# Altium footprint library PCBLIB.PcbLib: 557 footprints (part 18 of 36)
Each footprint in its own frame and in the unit in brackets; x right, y up, seen from the top. Pads: shape width x height; smd on the part's side, far side on the other; paste and mask are expansions set on the pad; w line width, h text height; cw(c..) or ccw(c..) is an arc to the next point about the centre after c.
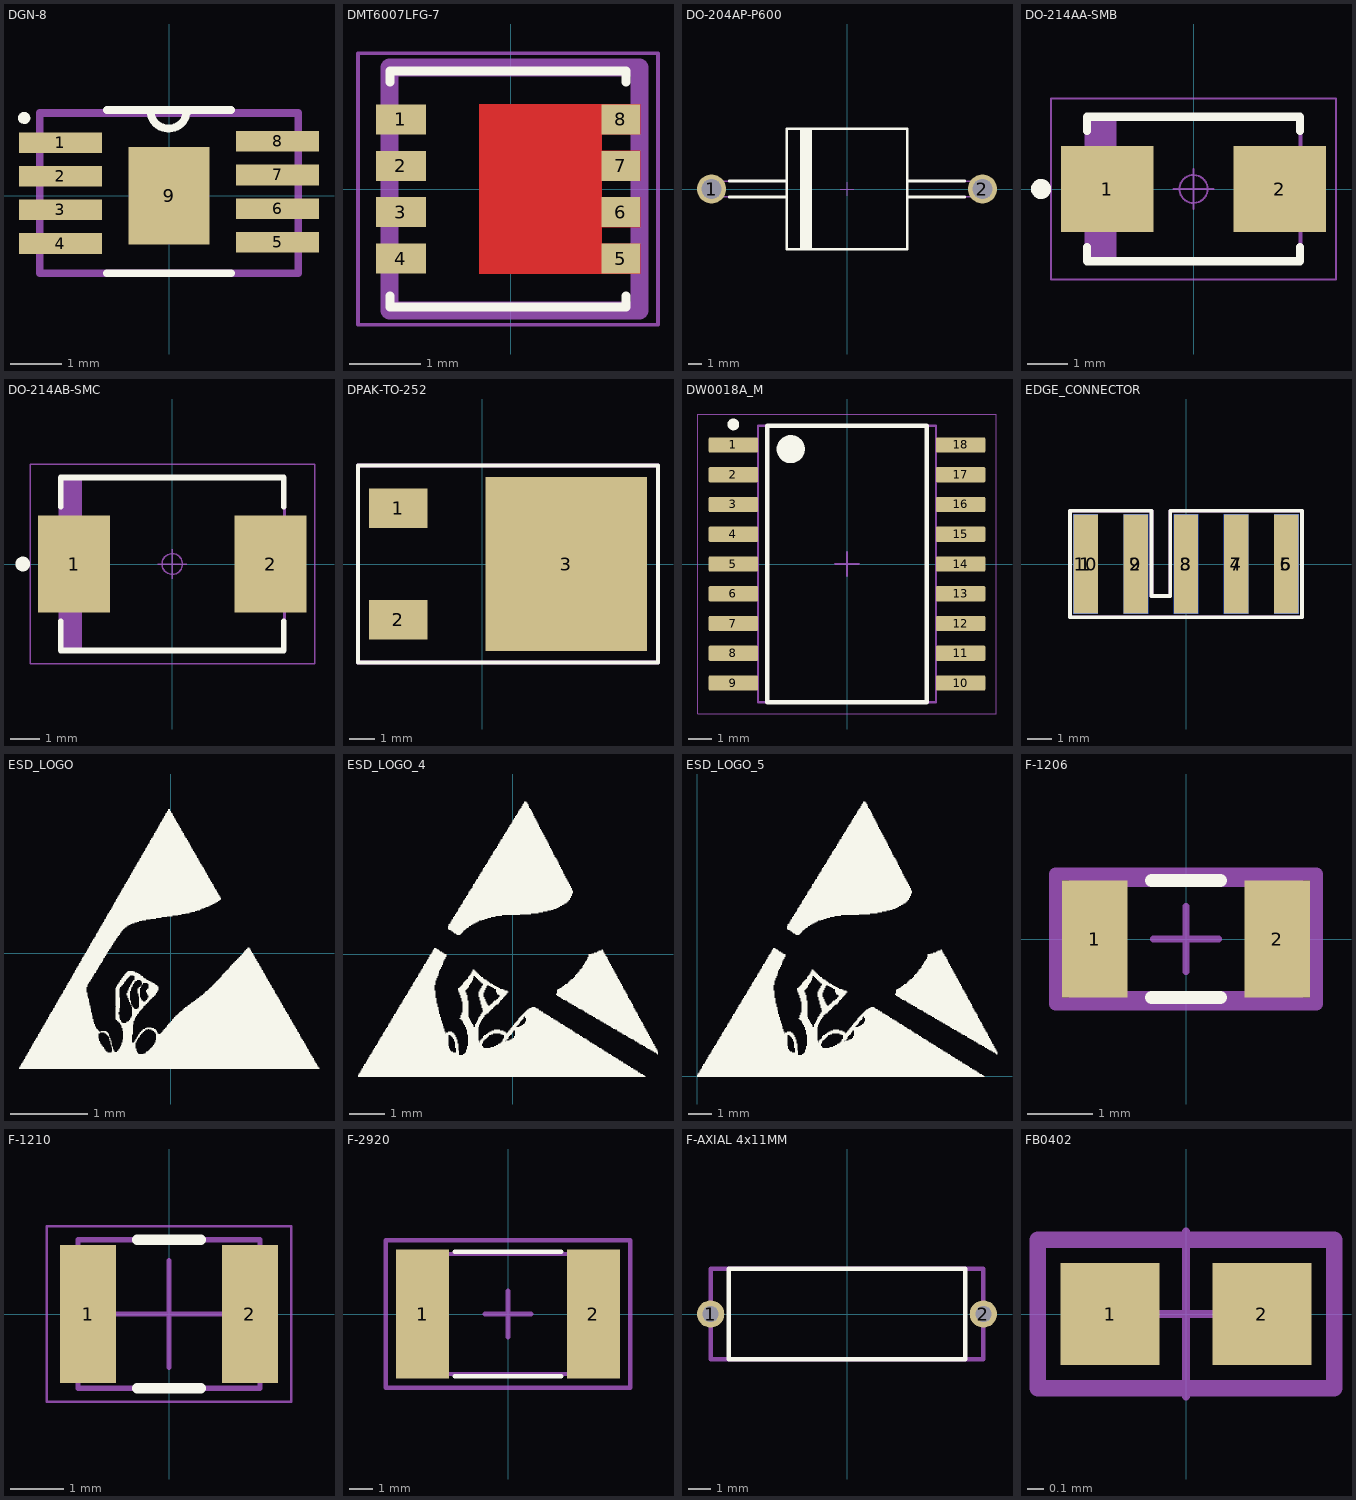
[diagram p17: the footprints below, top view; thin cyan lines are the x and y axes]

## DGN-8 [mm]
pads (9):
  rect 1.6x0.4 smd mask+0.07: 1(-2.1,1.025) 2(-2.1,0.375) 3(-2.1,-0.275) 4(-2.1,-0.925) 5(2.1,-0.9) 6(2.1,-0.25) 7(2.1,0.4) 8(2.1,1.05)
  rect 1.57x1.89 smd mask+0.07: 9(0,0)
Top Overlay:
  lines w0.15: -2.831,1.471 cw(c-2.8,1.5) -2.8,1.457 ; -1.2,-1.5 1.2,-1.5 ; -1.2,1.657 1.2,1.657 ; -0.359,1.641 ccw(c-0.017,1.641) -0.259,1.4 ccw(c-0.017,1.641) -0.017,1.3 ; 0,1.3 ccw(c0,1.641) 0.241,1.4 ccw(c0,1.641) 0.341,1.641
ASM Top:
  lines w0.15: -2.5,-1.5 2.5,-1.5 2.5,1.6 -2.5,1.6 -2.5,-1.5
  text ".designator" at -0.4,-0.1 h0.8
3D body "DGN8_1P89x1P57.step": height 1.09, standoff -0.05, extent -2.527,-1.5 2.527,1.598

## DMT6007LFG-7 [mm] "DMT6007LFG-7"
height 0.85
pads (8):
  rect 0.7x0.42 smd: 1(-1.54,0.975) 2(-1.54,0.325) 3(-1.54,-0.325) 4(-1.54,-0.975)
  rect 0.54x0.42 smd: 5(1.54,-0.975) 6(1.54,-0.325) 7(1.54,0.325) 8(1.54,0.975)
Top Layer:
  region: 1.81,0.765 1.27,0.765 1.27,0.535 1.81,0.535 1.81,0.115 1.27,0.115 1.27,-0.115 1.81,-0.115 1.81,-0.535 1.27,-0.535 1.27,-0.765 1.81,-0.765 1.81,-1.185 -0.44,-1.185 -0.44,1.185 1.81,1.185
Top Overlay:
  lines w0.127: -1.69,-1.499 -1.69,-1.65 1.61,-1.65 1.61,-1.499 ; -1.69,1.499 -1.69,1.65 1.61,1.65 1.61,1.499
Top Paste:
  region: 0.96,-0.9 -0.14,-0.9 -0.14,0.9 0.96,0.9
Top Solder:
  region: 1.37,-1.285 -0.54,-1.285 -0.54,1.285 1.37,1.285
Mechanical 15:
  lines w0.05: -2.14,-1.9 -2.14,1.9 2.06,1.9 2.06,-1.9 -2.14,-1.9
ASM Top:
  lines w0.254: -1.7,-1.7 1.8,-1.7 1.8,1.7 -1.7,1.7 -1.7,-1.7
  text ".designator" at -1.5,-0.5 h0.8
3D body "PowerDI3333-8.stp": height 0.85, standoff 0.04, extent -1.65,-1.65 1.65,1.65

## DO-204AP-P600 [mm] "Diode, Axial; Lead Spacing 20.40mm, Lead Dia. 1.25mm, Body Length 8.85mm, Body Dia. 8.85mm"
height 9.1
pads (2):
  round 2.2 hole 1.5: 1(-10.2,0) 2(10.2,0)
Top Overlay:
  lines w0.2: -8.88,-0.6 -4.55,-0.6 ; -8.88,0.6 -4.55,0.6 ; -3.45,-4.55 -3.45,4.55 ; -3.35,-4.55 -3.35,4.55 ; -3.25,-4.55 -3.25,4.55 ; -3.15,-4.55 -3.15,4.55 ; -3.05,-4.55 -3.05,4.55 ; -2.95,-4.55 -2.95,4.55 ; -2.85,-4.55 -2.85,4.55 ; -2.75,-4.55 -2.75,4.55 ; 4.55,-0.6 8.88,-0.6 ; 4.55,0.6 8.88,0.6 ; -4.55,-4.55 -4.55,4.55 4.55,4.55 4.55,-4.55 -4.55,-4.55
Mechanical 8:
  lines w0.05: -10.7,0 -10.2,0 ; -10.2,-0.5 -10.2,0 ; -10.2,0.5 -10.2,0 ; -9.7,0 -10.2,0 ; -0.5,0 0,0 ; 0,-0.5 0,0 ; 0,0.5 0,0 ; 0.5,0 0,0 ; 9.7,0 10.2,0 ; 10.2,-0.5 10.2,0 ; 10.2,0.5 10.2,0 ; 10.7,0 10.2,0
Mechanical 14:
  lines w0.1: -4.55,-0.6 -10.2,-0.6 cw(c-10.2,0) -10.2,0.6 -4.55,0.6 ; -3.45,-4.55 -3.45,4.55 ; -3.35,-4.55 -3.35,4.55 ; -3.25,-4.55 -3.25,4.55 ; -3.15,-4.55 -3.15,4.55 ; -3.05,-4.55 -3.05,4.55 ; -2.95,-4.55 -2.95,4.55 ; -2.85,-4.55 -2.85,4.55 ; -2.75,-4.55 -2.75,4.55 ; 4.55,-0.6 10.2,-0.6 ccw(c10.2,0) 10.2,0.6 4.55,0.6 ; -4.55,-4.55 -4.55,4.55 4.55,4.55 4.55,-4.55 -4.55,-4.55
3D body "DIOAD2040W125L885D885.stp": height 9.1, standoff -3.6, extent -10.799,-4.55 10.799,4.55

## DO-214AA-SMB [mm] "DO-214-AA/SMB Diode, Molded Body; 5.34mm L X 3.625mm W X 2.65mm H, IPC Medium Density"
height 2.65
pads (2):
  rect 2.3x2.15 smd: 1(-2.15,0) 2(2.15,0)
Top Overlay:
  circle w0.25: c-3.8,0 r0.125
  lines w0.2: -2.65,-1.45 -2.65,-1.8 2.65,-1.8 2.65,-1.45 ; -2.65,1.45 -2.65,1.8 2.65,1.8 2.65,1.45
Mechanical 14:
  lines w0.1: -2.57,-1.812 -2.57,1.812 ; -2.47,-1.812 -2.47,1.812 ; -2.37,-1.812 -2.37,1.812 ; -2.27,-1.812 -2.27,1.812 ; -2.17,-1.812 -2.17,1.812 ; -2.07,-1.812 -2.07,1.812 ; -1.97,-1.812 -1.97,1.812 ; -2.67,-1.812 2.67,-1.812 2.67,1.812 -2.67,1.812 ; -2.67,-1.812 -2.67,1.812 ; -2.67,-1.812 -2.67,1.812
Mechanical 15:
  circle w0.05: c0,0 r0.35
  lines w0.05: -0.5,0 0.5,0 ; 0,-0.5 0,0.5 ; -3.55,-2.25 3.55,-2.25 3.55,2.25 -3.55,2.25 -3.55,-2.25
3D body "DIOM5336X240N.stp": height 2.4, standoff 0, extent -2.7,-1.95 2.7,1.95

## DO-214AB-SMC [mm] "DO-214-AB/SMC Molded Diode, Body 7.95x5.9mm, IPC Medium Density"
height 2.65
pads (2):
  rect 2.45x3.3 smd: 1(-3.35,0) 2(3.35,0)
Top Overlay:
  circle w0.25: c-5.1,0 r0.125
  lines w0.2: -3.8,-1.95 -3.8,-2.95 3.8,-2.95 3.8,-1.95 ; -3.8,1.95 -3.8,2.95 3.8,2.95 3.8,1.95
Mechanical 14:
  lines w0.1: -3.725,-2.95 -3.725,2.95 ; -3.625,-2.95 -3.625,2.95 ; -3.525,-2.95 -3.525,2.95 ; -3.425,-2.95 -3.425,2.95 ; -3.325,-2.95 -3.325,2.95 ; -3.225,-2.95 -3.225,2.95 ; -3.125,-2.95 -3.125,2.95 ; -3.825,-2.95 3.825,-2.95 3.825,2.95 -3.825,2.95 -3.825,-2.95
Mechanical 15:
  circle w0.05: c0,0 r0.35
  lines w0.05: -0.5,0 0.5,0 ; 0,-0.5 0,0.5 ; -4.85,-3.4 4.85,-3.4 4.85,3.4 -4.85,3.4 -4.85,-3.4
3D body "DIOM7659X265N.stp": height 2.65, standoff 0, extent -3.975,-2.95 3.975,2.95

## DPAK-TO-252 [mil]
pads (3):
  rect 89x60 smd: 1(-127.5,85) 2(-127.5,-85)
  rect 245x265 smd: 3(127.5,0)
Top Overlay:
  lines w6: -189,-150 267,-150 267,150 -189,150 -189,-150
ASM Top:
  lines w6: -189,-150 267,-150 267,150 -189,150 -189,-150
  text ".designator" at 3.94,0 h31.5
3D body "DPAK_TO-252AA.STEP": height 94.99, standoff 0.5, extent -157.5,-132 240.14,133.11

## DW0018A_M [mm] "SOIC, 18-Leads, Body 11.8x7.6mm, Pitch 1.27mm, IPC Low Density"
height 2.65
pads (18):
  rrect15% 2.1x0.65 smd: 1(-4.85,5.08) 2(-4.85,3.81) 3(-4.85,2.54) 4(-4.85,1.27) 5(-4.85,0) 6(-4.85,-1.27) 7(-4.85,-2.54) 8(-4.85,-3.81) 9(-4.85,-5.08) 10(4.85,-5.08) 11(4.85,-3.81) 12(4.85,-2.54) 13(4.85,-1.27) 14(4.85,0) 15(4.85,1.27) 16(4.85,2.54) 17(4.85,3.81) 18(4.85,5.08)
Top Overlay:
  circle w0.25: c-4.85,5.955 r0.125
  circle w0.6: c-2.4,4.9 r0.3
  lines w0.2: -3.4,-5.9 -3.4,5.9 3.4,5.9 3.4,-5.9 -3.4,-5.9
Mechanical 15:
  lines w0.05: -6.375,-6.4 -6.375,6.4 6.375,6.4 6.375,-6.4 -6.375,-6.4
  lines w0.1: -0.5,0 0.5,0 ; 0,-0.5 0,0.5
ASM Top:
  circle w0.1: c-2.9,5 r0
  lines w0.1: -3.8,-5.9 3.8,-5.9 3.8,5.9 -3.8,5.9 -3.8,-5.9
  text ".designator" at -1.46,-0.1 h0.8
3D body "User Library-IPC SO.step": height 2.66, standoff -0.14, extent -5.188,-5.875 5.188,5.875

## EDGE_CONNECTOR [mil]
pads (10):
  rect 39x158 smd mask+1: 1(-160,0) 2(-80,0) 3(0,0) 4(80,0) 5(160,0)
  rect 39x158 smd far side mask+1: 6(160,0) 7(80,0) 8(0,0) 9(-80,0) 10(-160,0)
Top Overlay:
  lines w6: -185,-85 -185,85 -55,85 -55,-51 -25,-51 -25,85 185,85 185,-85 -185,-85
Bottom Overlay:
  lines w6: -185,-85 -185,85 -55,85 -55,-51 -25,-51 -25,85 185,85 185,-85 -185,-85
ASM Top:
  lines w6: -185,-85 -185,85 -55,85 -55,-51 -25,-51 -25,85 185,85 185,-85 -185,-85
  text ".designator" at 10,-35 h31.5

## ESD_LOGO [mm]
Top Overlay:
  drawing of 1 lines, arcs and shapes, not listed

## ESD_LOGO_4 [mm]
Top Overlay:
  drawing of 682 lines, arcs and shapes, not listed

## ESD_LOGO_5 [mm]
Top Overlay:
  drawing of 682 lines, arcs and shapes, not listed

## F-1206 [mm]
pads (2):
  rect 1x1.8 smd paste+0 mask+0: 1(-1.4,0) 2(1.4,0)
Top Overlay:
  lines w0.2: -0.525,-0.9 0.525,-0.9 ; -0.525,0.9 0.525,0.9
Mechanical 15:
  lines w0.2: -2,-1 -2,1 2,1 2,-1 -2,-1
Mechanical 16:
  lines w0.1: -0.5,0 0.5,0 ; 0,-0.5 0,0.5
ASM Top:
  lines w0.2: -1.7,-0.9 1.7,-0.9 1.7,0.9 -1.7,0.9 -1.7,-0.9
  text ".Designator" at 0,0.188 h1
3D body "Fuse_Littelfuse_1206L005-60WR_eec.STEP": height 1.25, standoff 0, extent -1.6,-0.825 1.6,0.825

## F-1210 [mm] "PTC Resettable Fuse, Body 3.215mmx2.575mm, BOURNS MF-USMF Series"
height 1.1
pads (2):
  rect 1.05x2.6 smd: 1(-1.525,0) 2(1.525,0)
Top Overlay:
  lines w0.2: -0.6,-1.4 0.6,-1.4 ; -0.6,1.4 0.6,1.4
Mechanical 8:
  lines w0.1: -1,0 0,0 ; 0,-1 0,0 ; 0,1 0,0 ; 1,0 0,0
Mechanical 15:
  lines w0.05: -2.3,-1.65 2.3,-1.65 2.3,1.65 -2.3,1.65 -2.3,-1.65
ASM Top:
  lines w0.1: -1.715,-1.4 1.715,-1.4 1.715,1.4 -1.715,1.4 -1.715,-1.4
  text ".designator" at -0.6,-0.2 h0.8
3D body "FUSR_BOURNS_MF-USMF005.stp": height 1.1, standoff 0, extent -1.715,-1.4 1.715,1.4

## F-2920 [mm]
pads (2):
  rect 2.3x5.6 smd mask+0: 1(-3.7,0) 2(3.7,0)
Top Overlay:
  lines w0.2: -2.3,-2.7 2.3,-2.7 ; -2.3,2.7 2.3,2.7
Mechanical 15:
  lines w0.2: -1,0 1,0 ; 0,-1 0,1 ; -5.3,-3.2 -5.3,3.2 5.3,3.2 5.3,-3.2 -5.3,-3.2
ASM Top:
  lines w0.152: -3.4,-2.6 3.7,-2.6 3.7,2.6 -3.4,2.6 -3.4,-2.6
  text ".designator" at -0.8,0 h0.8
3D body "SMDC185F_33-2.stp": height 1.2, standoff 0, extent -3.75,-2.55 3.75,2.55

## F-AXIAL 4x11MM [mm]
pads (2):
  round 1.2 hole 0.7 mask+0.05: 1(-6,0) 2(6,0)
Top Overlay:
  lines w0.2: -5.2,-2 5.2,-2 5.2,1.998 5.198,2 -5.2,2 -5.2,-2
ASM Top:
  lines w0.2: -6,1.998 6,1.998 6,-2 -6,-2 -6,2 -4.734,2
  text ".designator" at -2.4,-0.2 h0.8

## FB0402 [mm] "Chip Inductor, 2-Leads, EIA 0402, Metric 1005, Body 1x0.5mm, 0402IPC Medium Density"
height 0.55
pads (2):
  rect 0.6x0.62 smd: 1(-0.46,0) 2(0.46,0)
Mechanical 14:
  lines w0.1: -0.9,-0.45 -0.9,0.45 0.9,0.45 0.9,-0.45 -0.9,-0.45
Mechanical 15:
  lines w0.05: -0.5,0 0.5,0 ; 0,-0.5 0,0.5 ; -0.91,-0.46 -0.91,0.46 0.91,0.46 0.91,-0.46 -0.91,-0.46
3D body "INDC1005X55N.stp": height 0.55, standoff 0, extent -0.525,-0.275 0.525,0.275